# Altium footprint library mastermind.PCBLIB: 1061 footprints (part 38 of 67)
Each footprint in its own frame and in the unit in brackets; x right, y up, seen from the top. Pads: shape width x height; smd on the part's side, far side on the other; paste and mask are expansions set on the pad; w line width, h text height; cw(c..) or ccw(c..) is an arc to the next point about the centre after c.
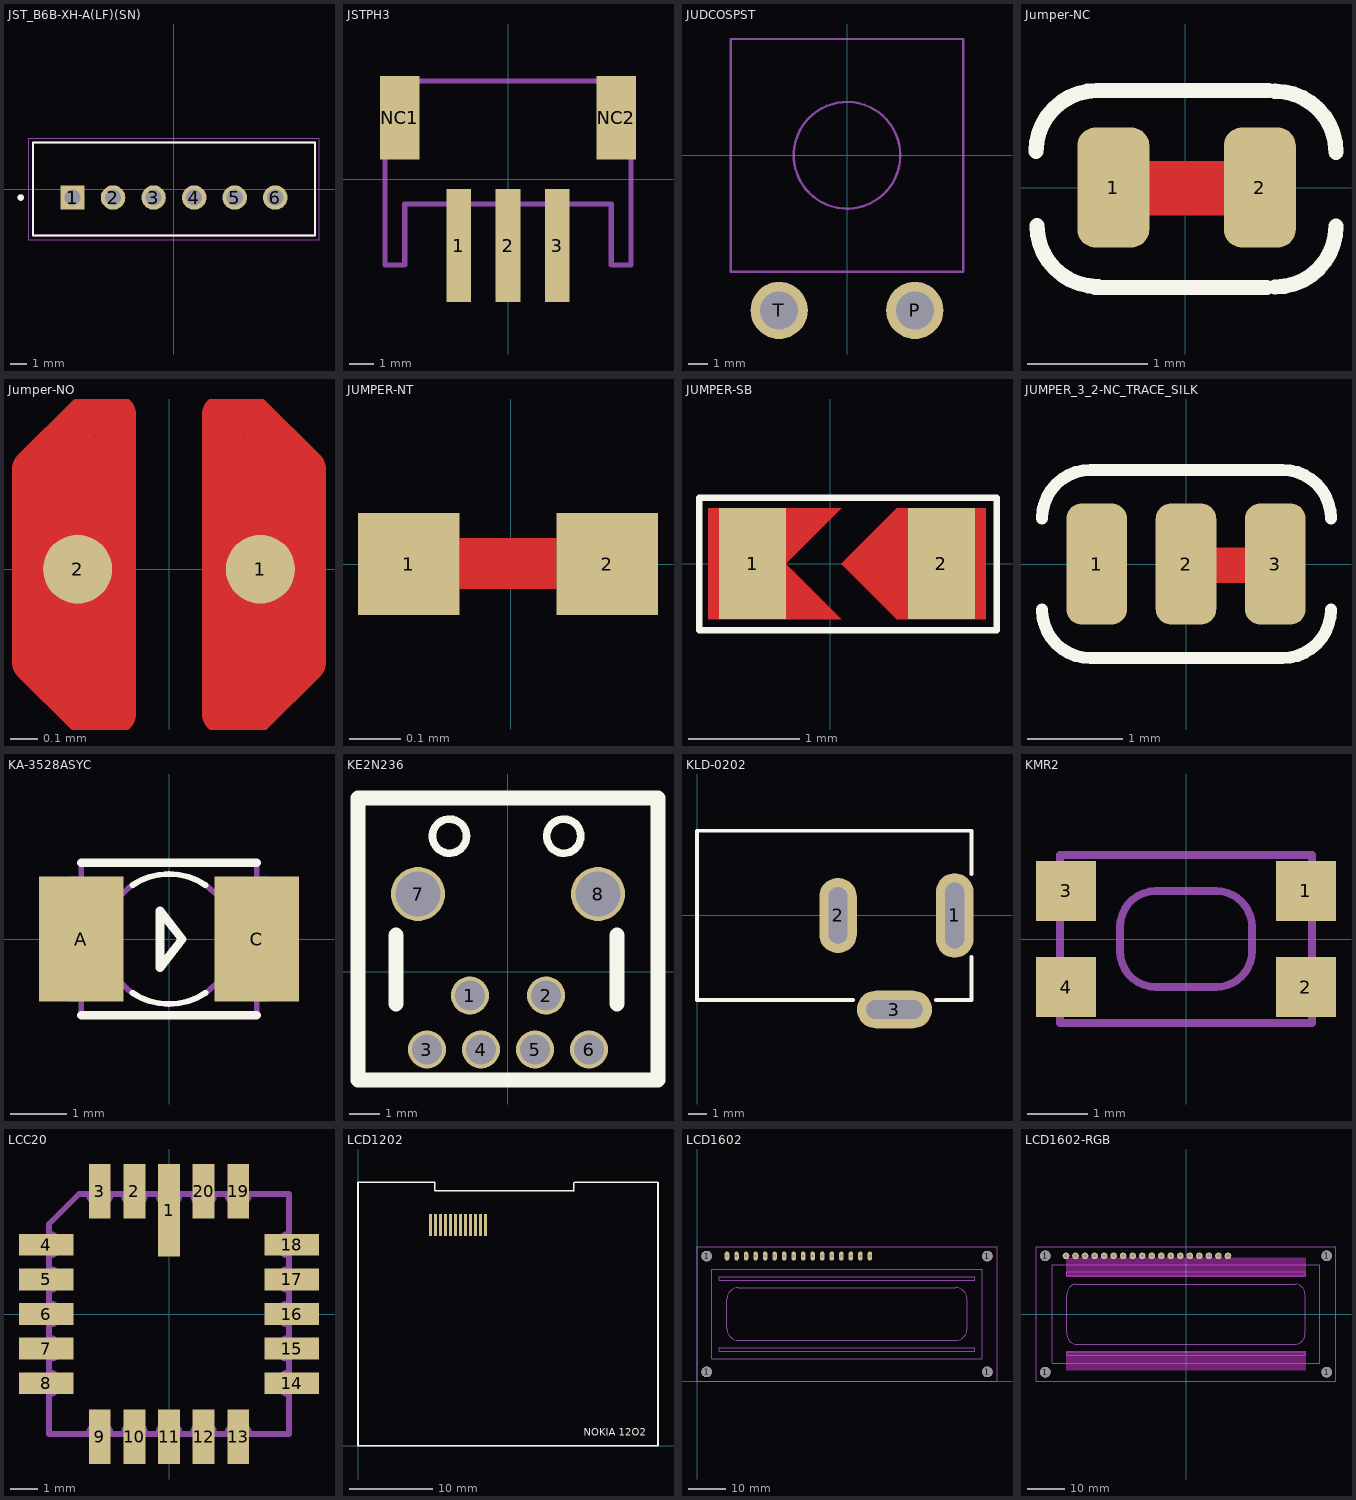
[diagram p37: the footprints below, top view; thin cyan lines are the x and y axes]

## JST_B6B-XH-A(LF)(SN) [mm]
pads (6):
  rect 1.508x1.508 hole 1: 1(-6.25,-0.525)
  round 1.508 hole 1: 2(-3.75,-0.525) 3(-1.25,-0.525) 4(1.25,-0.525) 5(3.75,-0.525) 6(6.25,-0.525)
Top Overlay:
  circle w0.2: c-9.45,-0.525 r0.1
  lines w0.127: -8.7,-2.875 8.7,-2.875 8.7,2.875 -8.7,2.875 -8.7,-2.875
Mechanical 13:
  circle w0.2: c-9.45,-0.525 r0.1
  lines w0.127: -8.7,-2.875 8.7,-2.875 8.7,2.875 -8.7,2.875 -8.7,-2.875
Mechanical 15:
  lines w0.05: -8.95,-3.125 -8.95,3.125 8.95,3.125 8.95,-3.125 -8.95,-3.125
3D body "step_temp.STEP": height 7, standoff -3.4, extent -8.7,-2.875 8.7,2.875

## JSTPH3 [mm]
pads (5):
  rect 1x4.6 smd: 1(-2,-2.7) 2(0,-2.7) 3(2,-2.7)
  rect 1.6x3.4 smd: NC1(-4.4,2.5) NC2(4.4,2.5)
Mechanical 2:
  lines w0.127: -5,0.5 -5,-3.5 -4.15,-3.5 -4.15,-1 -2.75,-1 ; -3.25,4 3.25,4 ; 0.75,-1 4.15,-1 4.15,-3.5 5,-3.5 5,0.5
Mechanical 8:
  lines w0.203: -5,-3.5 -5,4 5,4 5,-3.5 4.2,-3.5 4.2,-1 -4.2,-1 -4.2,-3.5 -5,-3.5

## JUDCOSPST [mm]
pads (2):
  round 3 hole 2: P(3.556,-8.128) T(-3.556,-8.128)
Mechanical 2:
  circle w0.127: c0,0 r2.794
  lines w0.127: -6.096,-6.096 -6.096,6.096 6.096,6.096 6.096,-6.096 -6.096,-6.096

## Jumper-NC [mm]
pads (2):
  rrect50% 0.6x1 smd: 1(-0.6,0)
  rrect50% 0.6x1 smd paste+0: 2(0.62,0)
Top Layer:
  region: -0.313,-0.23 0.334,-0.23 0.334,0.22 -0.313,0.22
Top Overlay:
  lines w0.127: -1.245,0.3 cw(c-0.737,0.3) -0.737,0.808 0.692,0.808 ; -1.236,-0.317 ccw(c-0.728,-0.317) -0.728,-0.825 ; -0.751,-0.832 0.677,-0.832 ; 0.747,-0.829 ccw(c0.747,-0.321) 1.255,-0.321 ; 0.747,0.803 cw(c0.747,0.295) 1.255,0.295
Top Paste:
  rectangle: -0.313,-0.23 0.334,0.22

## Jumper-NO [mil]
pads (2):
  round 10 smd: 1(13.25,0) 2(-13.25,0)
Top Layer:
  lines w6: -7.75,-12.5 -7.75,-16.5 -12.25,-21 ; 7.75,-12.5 7.75,-16.5 12.25,-21 ; -12.25,-21 -19.75,-13.5 -19.75,14.5 -11.75,22.5 -7.75,22.5 -7.75,-6 -7.75,-21 -12.25,-21 ; 12.25,-21 19.75,-13.5 19.75,14.5 11.75,22.5 7.75,22.5 7.75,-6 7.75,-21 12.25,-21 ; -18.25,-11 -13.25,-16 -13.25,17.5 -18.25,12.5 -18.25,-11 ; 13.25,-16 13.25,17.5 18.25,12.5 18.25,-11 13.25,-16
Top Solder:
  lines w6: -7.75,-12.5 -7.75,-16.5 -12.25,-21 ; 7.75,-12.5 7.75,-16.5 12.25,-21 ; -12.25,-21 -19.75,-13.5 -19.75,14.5 -11.75,22.5 -7.75,22.5 -7.75,-6 -7.75,-21 -12.25,-21 ; 12.25,-21 19.75,-13.5 19.75,14.5 11.75,22.5 7.75,22.5 7.75,-6 7.75,-21 12.25,-21 ; -18.25,-11 -13.25,-16 -13.25,17.5 -18.25,12.5 -18.25,-11 ; 13.25,-16 13.25,17.5 18.25,12.5 18.25,-11 13.25,-16

## JUMPER-NT [mm]
pads (2):
  rect 0.2x0.2 smd paste+0 mask+0: 1(-0.2,0)
  rect 0.2x0.2 smd mask+0: 2(0.19,0)
Top Layer:
  rectangle: -0.1,-0.049 0.09,0.051

## JUMPER-SB [mm]
pads (2):
  rect 0.6x1 smd: 1(-0.7,0)
  rect 0.6x1 smd paste+0: 2(1,0)
Top Layer:
  region: -1.1,0.5 0.1,0.5 -0.4,0 0.1,-0.5 -1.1,-0.5
  region: 0.6,0.5 0.1,0 0.6,-0.5 1.4,-0.5 1.4,0.5
Top Overlay:
  lines w0.06: -1.181,-0.601 -1.181,0.593 1.499,0.593 1.499,-0.601 -1.181,-0.601

## JUMPER_3_2-NC_TRACE_SILK [mm] "SMT-JUMPER_3_2-NC_TRACE_SILK"
pads (3):
  rrect50% 0.635x1.27 smd paste+0: 1(-0.936,0) 2(0,0) 3(0.936,0)
Top Layer:
  rectangle: -0.127,-0.201 1.016,0.173
Top Overlay:
  lines w0.127: -1.508,-0.478 ccw(c-1,-0.478) -1,-0.986 1.01,-0.986 ccw(c1.01,-0.478) 1.518,-0.478 ; -1.508,0.478 cw(c-1,0.478) -1,0.986 1.01,0.986 cw(c1.01,0.478) 1.518,0.478

## KA-3528ASYC [mm]
pads (2):
  rect 1.5x2.2 smd: A(-1.55,0) C(1.55,0)
Top Overlay:
  lines w0.102: -0.65,-0.95 ccw(c0,0.006) 0.65,-0.95 ; -0.65,0.95 cw(c0,-0.006) 0.65,0.95
  lines w0.152: -1.55,-1.35 1.55,-1.35 ; -1.55,1.35 1.55,1.35 ; -0.159,-0.506 0.235,-0.002 -0.159,0.501 -0.159,-0.506
Mechanical 29 (Mech34):
  circle w0.102: c0,0 r1.15
  region: -1.75,-1.1 -1.75,-0.6 -1.6,-0.6 -1.6,-1.1
  region: -1.75,0.6 -1.75,1.1 -1.6,1.1 -1.6,0.6
  region: 1.75,-0.6 1.75,-1.1 1.6,-1.1 1.6,-0.6
  region: 1.75,1.1 1.75,0.6 1.6,0.6 1.6,1.1
  lines w0.102: -1.55,-1.35 -1.55,1.35 ; 1.55,-1.35 1.55,1.35

## KE2N236 [mm]
height 1.2
pads (8):
  round 1.27 hole 1: 1(-1.27,-0.792) 2(1.27,-0.792) 3(-2.7,-2.592) 4(-0.9,-2.592) 5(0.9,-2.592) 6(2.7,-2.592)
  round 1.8 hole 1.5: 7(-3,2.592) 8(3,2.592)
Top Overlay:
  circle w0.254: c-1.952,4.52 r0.568
  circle w0.254: c1.858,4.52 r0.568
  lines w0.508: -3.73,-1.068 -3.73,1.218 ; 3.636,-1.068 3.636,1.218 ; -5,-3.608 -5,5.792 5,5.792 5,-3.608 -5,-3.608
3D body "Optical reader(1).STEP": height 6.49, standoff -0.01, extent -4.746,-4.54 4.754,5.96

## KLD-0202 [mm]
pads (3):
  oval 2x4.5 hole 1 slot 3.5 at 90 deg: 1(13.692,-0.001)
  oval 2x4 hole 1 slot 3 at 90 deg: 2(7.492,-0.001)
  oval 4x2 hole 1 slot 3 at 0 deg: 3(10.492,-5.001)
Top Overlay:
  lines w0.2: 8.292,-4.501 -0.008,-4.501 -0.008,4.499 14.592,4.499 14.592,2.199 ; 12.692,-4.501 14.592,-4.501 14.592,-2.201
3D body "Jack 12V DC.STEP": height 11, standoff -4.1, extent -0.268,-5.306 13.932,4.494

## KMR2 [mm]
pads (4):
  rect 1x1 smd: 1(2,0.8) 2(2,-0.8) 3(-2,0.8) 4(-2,-0.8)
Mechanical 2:
  lines w0.127: -2.1,-1.4 2.1,-1.4 2.1,1.4 -2.1,1.4 -2.1,-1.4 ; -1.1,-0.2 ccw(c-0.5,-0.2) -0.5,-0.8 0.5,-0.8 ccw(c0.5,-0.2) 1.1,-0.2 1.1,0.2 ccw(c0.5,0.2) 0.5,0.8 -0.5,0.8 ccw(c-0.5,0.2) -1.1,0.2 -1.1,-0.2

## LCC20 [mil]
pads (20):
  rect 31.5x133.86 smd: 1(0,149.61)
  rect 31.5x78.74 smd: 2(-50,177.17) 3(-100,177.17) 9(-100,-177.17) 10(-50,-177.17) 11(0,-177.17) 12(50,-177.17) 13(100,-177.17) 19(100,177.17) 20(50,177.17)
  rect 78.74x31.5 smd: 4(-177.17,100) 5(-177.17,50) 6(-177.17,0) 7(-177.17,-50) 8(-177.17,-100) 14(177.17,-100) 15(177.17,-50) 16(177.17,0) 17(177.17,50) 18(177.17,100)
Mechanical 8:
  lines w8: -173.23,-173.62 -173.23,-173.23 ; -173.23,-115.75 -173.23,-173.23 ; -173.23,-84.25 -173.23,-65.75 ; -173.23,-34.25 -173.23,-15.75 ; -173.23,15.75 -173.23,34.25 ; -173.23,65.75 -173.23,84.25 ; -173.23,115.75 -173.23,129.92 -129.92,173.23 -115.75,173.23 ; -173.17,-115.75 ccw(c-173.17,-100) -173.17,-84.25 ; -173.17,-65.75 ccw(c-173.17,-50) -173.17,-34.25 ; -173.17,-15.75 ccw(c-173.17,0) -173.17,15.75 ; -173.17,34.25 ccw(c-173.17,50) -173.17,65.75 ; -173.17,84.25 ccw(c-173.17,100) -173.17,115.75 ; -115.75,-173.23 -173.23,-173.23 ; -115.75,-173.17 cw(c-100,-173.17) -84.25,-173.17 ; -115.75,173.17 ccw(c-100,173.17) -84.25,173.17 ; -84.25,-173.23 -65.75,-173.23 ; -84.25,173.23 -65.75,173.23 ; -65.75,-173.17 cw(c-50,-173.17) -34.25,-173.17 ; -65.75,173.17 ccw(c-50,173.17) -34.25,173.17 ; -34.25,-173.23 -15.75,-173.23 ; -34.25,173.23 -15.75,173.23 ; -15.75,-173.17 cw(c0,-173.17) 15.75,-173.17 ; -15.75,173.17 ccw(c0,173.17) 15.75,173.17 ; 15.75,-173.23 34.25,-173.23 ; 15.75,173.23 34.25,173.23 ; 34.25,-173.17 cw(c50,-173.17) 65.75,-173.17 ; 34.25,173.17 ccw(c50,173.17) 65.75,173.17 ; 65.75,-173.23 84.25,-173.23 ; 65.75,173.23 84.25,173.23 ; 84.25,-173.17 cw(c100,-173.17) 115.75,-173.17 ; 84.25,173.17 ccw(c100,173.17) 115.75,173.17 ; 115.75,-173.23 173.23,-173.23 173.23,-115.75 ; 115.75,173.23 173.23,173.23 173.23,115.75 ; 173.17,-115.75 cw(c173.17,-100) 173.17,-84.25 ; 173.17,-65.75 cw(c173.17,-50) 173.17,-34.25 ; 173.17,-15.75 cw(c173.17,0) 173.17,15.75 ; 173.17,34.25 cw(c173.17,50) 173.17,65.75 ; 173.17,84.25 cw(c173.17,100) 173.17,115.75 ; 173.23,-84.25 173.23,-65.75 ; 173.23,-34.25 173.23,-15.75 ; 173.23,15.75 173.23,34.25 ; 173.23,65.75 173.23,84.25

## LCD1202 [mm]
pads (12):
  rect 0.38x2.6 smd: 1(9.303,26.492) 2(9.903,26.492) 3(11.103,26.492) 4(11.703,26.492) 5(12.303,26.492) 5(12.903,26.492) 6(10.503,26.492) 6(13.503,26.492) 6(14.103,26.492) 7(14.703,26.492) 8(15.303,26.492) 9(8.703,26.492)
Top Overlay:
  lines w0.2: 0,31.6 0,0 36,0 ; 0.02,31.6 9.22,31.6 9.22,30.6 25.883,30.572 25.883,31.572 ; 26.01,31.6 36.01,31.6 ; 36.017,0 36.017,31.6
  text "NOKIA 12O2" at 27.102,0.864 h1.52
3D body "LCD 12021.STEP": height 2.35, standoff 0, extent 0.15,0.02 35.85,31.58

## LCD1602 [mil]
pads (20):
  round 110.24 hole 110.24: 1(100,100) 1(100,1317.32) 1(3049.61,100) 1(3049.61,1317.32)
  oval 47.25x94.5 hole 31.5: 1(314.96,1317.32) 2(414.96,1317.32) 3(514.96,1317.32) 4(614.96,1317.32) 5(714.96,1317.32) 6(814.96,1317.32) 7(914.96,1317.32) 8(1014.96,1317.32) 9(1114.96,1317.32) 10(1214.96,1317.32) 11(1314.96,1317.32) 12(1414.96,1317.32) 13(1514.96,1317.32) 14(1614.96,1317.32) 15(1714.96,1317.32) 16(1814.96,1317.32)
Mechanical 2:
  lines w5: 0,0 0,1417.32 3149.61,1417.32 3149.61,0 0,0 ; 157.48,236.22 157.48,1181.1 2992.13,1181.1 2992.13,236.22 157.48,236.22 ; 236.22,314.96 236.22,354.33 2913.39,354.33 2913.39,314.96 236.22,314.96 ; 236.22,1062.99 236.22,1102.36 2913.39,1102.36 2913.39,1062.99 236.22,1062.99 ; 314.96,551.18 ccw(c433.07,551.18) 433.07,433.07 2716.54,433.07 ccw(c2716.54,551.18) 2834.65,551.18 2834.65,866.14 ccw(c2716.54,866.14) 2716.54,984.25 433.07,984.25 ccw(c433.07,866.14) 314.96,866.14 314.96,551.18

## LCD1602-RGB [mil]
pads (22):
  round 110.24 hole 110.24: 1(-1476.38,-610.24) 1(-1476.38,610.24) 1(1476.38,-610.24) 1(1476.38,610.24)
  round 70 hole 39.37: 1(-1259.84,610.24) 2(-1159.84,610.24) 3(-1059.84,610.24) 4(-959.84,610.24) 5(-859.84,610.24) 6(-759.84,610.24) 7(-659.84,610.24) 8(-559.84,610.24) 9(-459.84,610.24) 10(-359.84,610.24) 11(-259.84,610.24) 12(-159.84,610.24) 13(-59.84,610.24) 14(40.16,610.24) 15(140.16,610.24) 16(240.16,610.24) 17(340.16,610.24) 18(440.16,610.24)
Top Layer keep-out:
  region: -1259.84,393.7 -1259.84,590.55 1259.84,590.55 1259.84,393.7
  region: -1259.84,-590.55 -1259.84,-393.7 1259.84,-393.7 1259.84,-590.55
Mechanical 2:
  lines w5: -1574.8,-708.66 1574.8,-708.66 1574.8,708.66 -1574.8,708.66 -1574.8,-708.66 ; -1403.54,-517.72 1403.54,-517.72 1403.54,517.72 -1403.54,517.72 -1403.54,-517.72 ; -1250,-435.04 1250,-435.04 1250,-395.67 -1250,-395.67 -1250,-435.04 ; -1250,-198.82 ccw(c-1144.41,-211.34) -1156.93,-316.93 1146.54,-316.93 ccw(c1139.21,-206.15) 1250,-198.82 1250,196.14 ccw(c1139.21,203.47) 1146.54,314.25 -1156.93,314.25 ccw(c-1144.41,208.66) -1250,196.14 -1250,-198.82 ; -1250,402.99 1250,402.99 1250,442.36 -1250,442.36 -1250,402.99